# Altium footprint library TMC_Silk_GFX.PcbLib: 5 footprints
Each footprint in its own frame and in the unit in brackets; x right, y up, seen from the top. Pads: shape width x height; smd on the part's side, far side on the other; paste and mask are expansions set on the pad; w line width, h text height; cw(c..) or ccw(c..) is an arc to the next point about the centre after c.
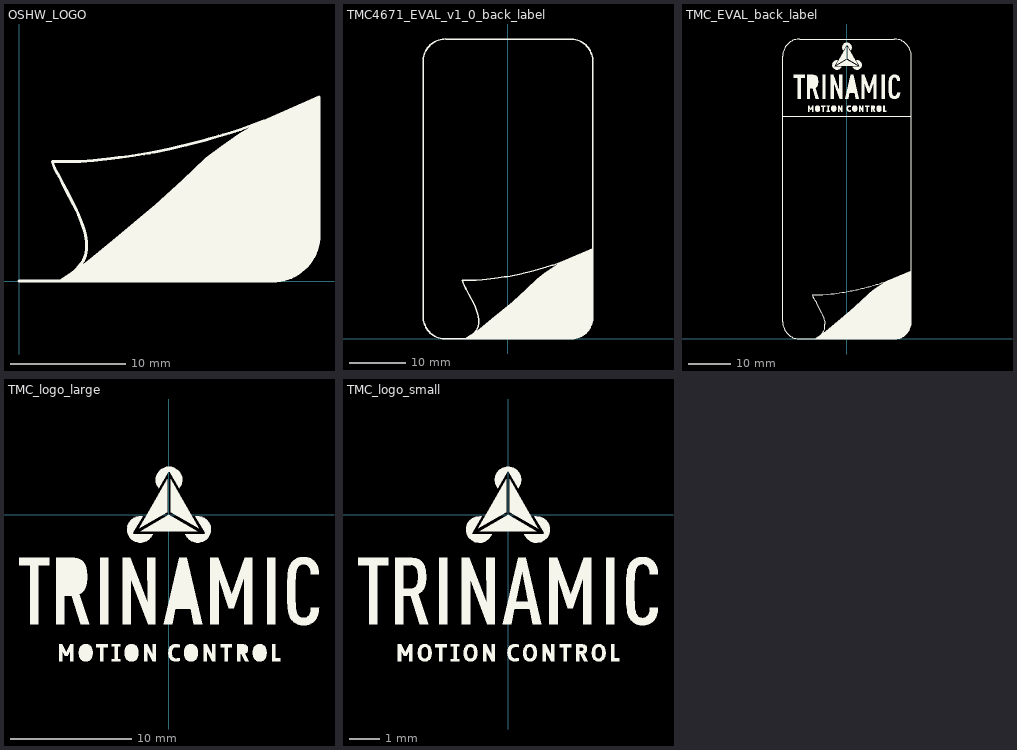
[diagram p0: the footprints below, top view; thin cyan lines are the x and y axes]

## OSHW_LOGO [mm]
Top Overlay:
  drawing of 221 lines, arcs and shapes, not listed

## TMC4671_EVAL_v1_0_back_label [mm]
Top Overlay:
  drawing of 227 lines, arcs and shapes, not listed

## TMC_EVAL_back_label [mm]
Top Overlay:
  drawing of 365 lines, arcs and shapes, not listed

## TMC_logo_large [mm]
Top Overlay:
  drawing of 137 lines, arcs and shapes, not listed

## TMC_logo_small [mm]
Top Overlay:
  drawing of 34 lines, arcs and shapes, not listed